# Altium footprint library Indruino.PcbLib: 383 footprints (part 9 of 24)
Each footprint in its own frame and in the unit in brackets; x right, y up, seen from the top. Pads: shape width x height; smd on the part's side, far side on the other; paste and mask are expansions set on the pad; w line width, h text height; cw(c..) or ccw(c..) is an arc to the next point about the centre after c.
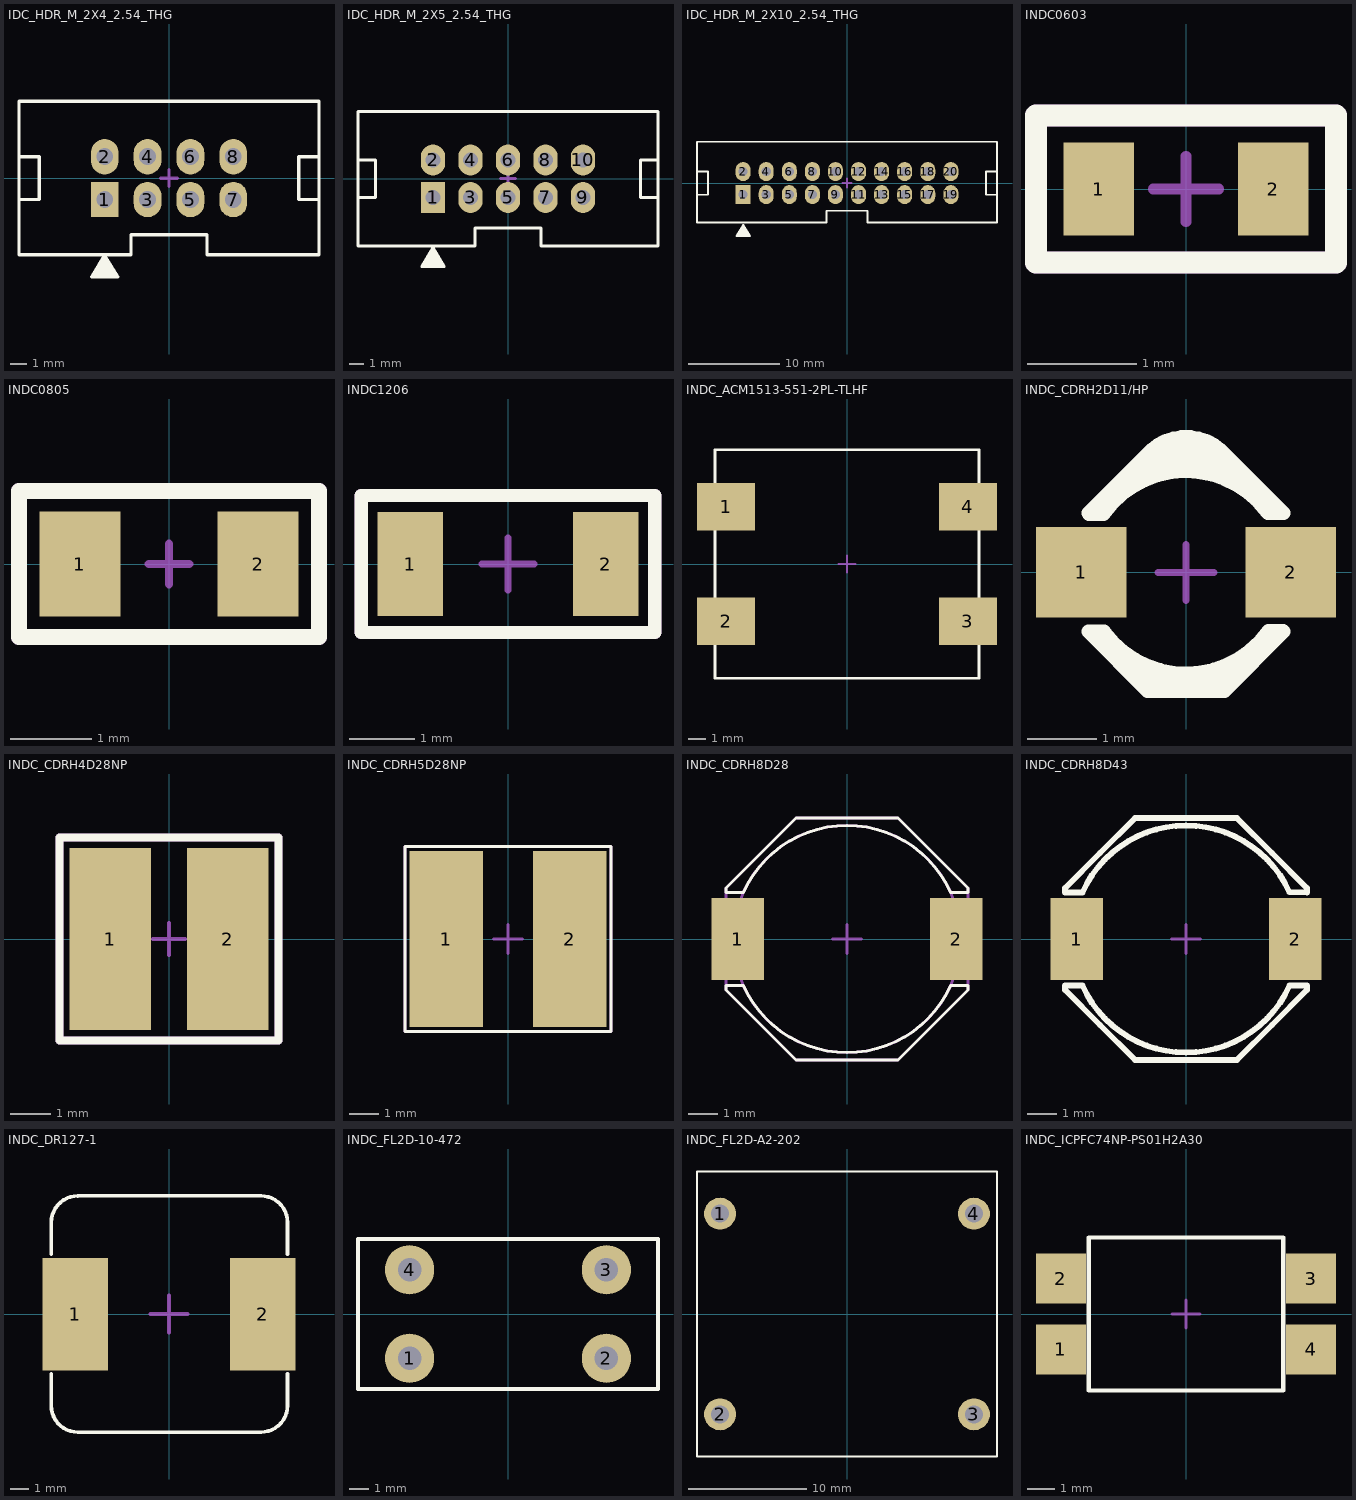
[diagram p8: the footprints below, top view; thin cyan lines are the x and y axes]

## IDC_HDR_M_2X4_2.54_THG [mm]
pads (8):
  rect 1.65x2.1 hole 1: 1(-3.81,-1.27)
  oval 1.65x2.1 hole 1: 2(-3.81,1.27) 3(-1.27,-1.27) 4(-1.27,1.27) 5(1.27,-1.27) 6(1.27,1.27) 7(3.81,-1.27) 8(3.81,1.27)
Top Overlay:
  region: -4.572,-5.842 -3.048,-5.842 -3.81,-4.572
  lines w0.2: -8.89,-1.27 -7.69,-1.27 -7.69,1.27 -8.89,1.27 ; 8.89,-1.27 7.69,-1.27 7.69,1.27 8.89,1.27 ; -8.89,-4.55 -2.25,-4.55 -2.25,-3.35 2.25,-3.35 2.25,-4.55 8.89,-4.55 8.89,4.55 -8.89,4.55 -8.89,-4.55 ; -4.572,-5.842 -3.048,-5.842 -3.81,-4.572 -4.572,-5.842
Mechanical 15:
  lines w0.2: -0.5,0 0.5,0 ; 0,-0.5 0,0.5
3D body "User Library-BH_08_V.STEP": height 8.9, standoff -3.2, extent -8.89,-4.45 8.89,4.65

## IDC_HDR_M_2X5_2.54_THG [mm]
pads (10):
  rect 1.65x2.1 hole 1: 1(-5.08,-1.27)
  oval 1.65x2.1 hole 1: 2(-5.08,1.27) 3(-2.54,-1.27) 4(-2.54,1.27) 5(0,-1.27) 6(0,1.27) 7(2.54,-1.27) 8(2.54,1.27) 9(5.08,-1.27) 10(5.08,1.27)
Top Overlay:
  region: -5.842,-5.942 -4.318,-5.942 -5.08,-4.672
  lines w0.2: -10.16,-1.27 -8.96,-1.27 -8.96,1.27 -10.16,1.27 ; 10.16,-1.27 8.96,-1.27 8.96,1.27 10.16,1.27 ; -10.16,-4.55 -10.16,4.55 10.16,4.55 10.16,-4.55 2.25,-4.55 2.25,-3.35 -2.25,-3.35 -2.25,-4.55 -10.16,-4.55 ; -5.842,-5.942 -4.318,-5.942 -5.08,-4.672 -5.842,-5.942
Mechanical 15:
  lines w0.2: -0.5,0 0.5,0 ; 0,-0.5 0,0.5
3D body "User Library-BH-10__64.STEP": height 9.1, standoff -3, extent -10.25,-4.65 10.25,4.65

## IDC_HDR_M_2X10_2.54_THG [mm]
pads (20):
  rect 1.65x2.1 hole 1: 1(-11.43,-1.27)
  oval 1.65x2.1 hole 1: 2(-11.43,1.27) 3(-8.89,-1.27) 4(-8.89,1.27) 5(-6.35,-1.27) 6(-6.35,1.27) 7(-3.81,-1.27) 8(-3.81,1.27) 9(-1.27,-1.27) 10(-1.27,1.27) 11(1.27,-1.27) 12(1.27,1.27) 13(3.81,-1.27) 14(3.81,1.27) 15(6.35,-1.27) 16(6.35,1.27) 17(8.89,-1.27) 18(8.89,1.27) 19(11.43,-1.27) 20(11.43,1.27)
Top Overlay:
  region: -12.192,-5.842 -10.668,-5.842 -11.43,-4.572
  lines w0.2: -16.51,-1.27 -15.31,-1.27 -15.31,1.27 -16.51,1.27 ; 16.51,-1.27 15.31,-1.27 15.31,1.27 16.51,1.27 ; -16.51,-4.318 -16.51,4.55 16.51,4.55 16.51,-4.318 2.25,-4.318 2.25,-3.048 -2.25,-3.048 -2.25,-4.318 -16.51,-4.318 ; -12.192,-5.842 -11.43,-4.572 -10.668,-5.842 -12.192,-5.842
Mechanical 15:
  lines w0.2: -0.5,0 0.5,0 ; 0,-0.5 0,0.5
3D body "User Library-idc-20_asm.STEP": height 9, standoff -3.2, extent -16.35,-4.064 16.35,4.436

## INDC0603 [mm]
pads (2):
  rect 0.65x0.85 smd: 1(-0.8,0) 2(0.8,0)
Top Overlay:
  lines w0.2: -1.375,-0.675 1.375,-0.675 1.375,0.675 -1.375,0.675 -1.375,-0.675
Mechanical 13:
  lines w0.2: -1.375,-0.675 1.375,-0.675 1.375,0.675 -1.375,0.675 -1.375,-0.675
  text "'.Designator'" at -1.03,-0.397 h0.7
Mechanical 15:
  lines w0.1: -0.3,0 0.3,0 ; 0,-0.3 0,0.3
3D body "User Library-cap_0603-1.STEP": height 0.79, standoff -0.01, extent -0.801,-0.394 0.799,0.406

## INDC0805 [mm]
pads (2):
  rect 1x1.3 smd: 1(-1.1,0) 2(1.1,0)
Top Overlay:
  lines w0.2: -1.85,-0.9 1.85,-0.9 1.85,0.9 -1.85,0.9 -1.85,-0.9
Mechanical 13:
  lines w0.2: -1.85,-0.9 -1.85,0.9 1.85,0.9 1.85,-0.9 -1.85,-0.9
  text "'.Designator'" at -1.475,-0.458 h0.8
Mechanical 15:
  lines w0.1: -0.25,0 0.25,0 ; 0,-0.25 0,0.25
3D body "User Library-Chip InductorINDC2012X130N.step": height 1.18, standoff -0.02, extent -1,-0.65 1,0.65

## INDC1206 [mm]
pads (2):
  rect 1x1.6 smd: 1(-1.5,0) 2(1.5,0)
Top Overlay:
  lines w0.2: -2.25,-1.05 -2.25,1.05 2.25,1.05 2.25,-1.05 -2.25,-1.05
Mechanical 13:
  lines w0.2: -2.25,-1.05 -2.25,1.05 2.25,1.05 2.25,-1.05 -2.25,-1.05
  text "'.Designator'" at -1.8,-0.383 h0.8
Mechanical 15:
  lines w0.1: -0.4,0 0.4,0 ; 0,-0.4 0,0.4
3D body "User Library-ind_1206.step": height 1.1, standoff 0, extent -1.6,-0.8 1.6,0.8

## INDC_ACM1513-551-2PL-TLHF [mm] "15mm x 13mm, Shielded, Nonstandard"
height 6
pads (4):
  rect 3.3x2.7 smd: 1(-6.875,3.25) 2(-6.875,-3.25) 3(6.875,-3.25) 4(6.875,3.25)
Top Overlay:
  lines w0.15: -7.5,-6.5 -7.5,6.5 7.5,6.5 7.5,-6.5 -7.5,-6.5
Mechanical 15:
  lines w0.1: -0.5,0 0.5,0 ; 0,-0.5 0,0.5
3D body "acm1513.step": height 5.58, standoff 0.07, extent -7.5,-6.5 7.5,6.5

## INDC_CDRH2D11/HP [mm] "Chip Inductor, Body 3.0x3.0mm, IPC High Density"
height 1.1
pads (2):
  rect 1.3x1.3 smd: 1(-1.5,0) 2(1.5,0)
Top Overlay:
  region: -1.4,-0.85 -0.55,-1.7 0.55,-1.7 1.4,-0.85 1.388,-0.838 1.183,-0.838 1.076,-0.972 0.819,-1.196 0.517,-1.355 0.185,-1.438 -0.156,-1.442 -0.489,-1.365 -0.795,-1.213 -1.056,-0.993 -1.166,-0.862 -1.178,-0.85
  region: -1.183,0.838 -1.076,0.972 -0.819,1.196 -0.517,1.355 -0.185,1.438 0.156,1.442 0.489,1.365 0.795,1.213 1.056,0.993 1.166,0.862 1.178,0.85 1.4,0.85 0.495,1.755 0.505,1.745 0.453,1.792 0.335,1.865 0.206,1.915 0.069,1.94 -0.069,1.94 -0.206,1.915 -0.335,1.865 -0.453,1.792 -0.505,1.745 -0.495,1.755 -1.4,0.85 -1.388,0.838
  lines w0.2: -1.4,0.85 -0.495,1.755 ; -1.388,0.838 -1.183,0.838 cw(c0,0) 1.166,0.862 ; -1.178,-0.85 -1.4,-0.85 -0.55,-1.7 0.55,-1.7 1.4,-0.85 ; -1.166,-0.862 ccw(c0,0) 1.183,-0.838 1.388,-0.838 ; -0.505,1.745 cw(c0,1.19) 0.505,1.745 ; 0.495,1.755 1.4,0.85 1.178,0.85
Mechanical 15:
  lines w0.1: -0.4,0 0.4,0 ; 0,-0.4 0,0.4
3D body "User Library-CDRH2D18-1.step": height 2.05, standoff 0, extent -2.263,-2.263 2.263,2.263

## INDC_CDRH4D28NP [mm] "Chip Inductor, Body 4.7x4.7mm, IPC High Density"
height 3
pads (2):
  rect 2x4.5 smd: 1(-1.45,0) 2(1.45,0)
Top Overlay:
  lines w0.2: -2.7,-2.5 -2.7,2.5 2.7,2.5 2.7,-2.5 -2.7,-2.5
Mechanical 13:
  lines w0.2: -2.7,-2.5 -2.7,2.5 2.7,2.5 2.7,-2.5 -2.7,-2.5
  text "'.Designator'" at -2.1,-0.5 h1.2
Mechanical 15:
  lines w0.1: -0.4,0 0.4,0 ; 0,-0.4 0,0.4
3D body "User Library-CDRH4D28.step": height 2.92, standoff 0.01, extent -2.45,-2.45 2.45,2.45

## INDC_CDRH5D28NP [mm] "Chip Inductor, Body 6.0x6.0mm, IPC High Density"
height 3
pads (2):
  rect 2.5x6 smd: 1(-2.1,0) 2(2.1,0)
Top Overlay:
  lines w0.1: -3.5,-3.15 3.5,-3.15 3.5,3.15 -3.5,3.15 -3.5,-3.15
Mechanical 13:
  lines w0.1: -3.5,-3.15 -3.5,3.15 3.5,3.15 3.5,-3.15 -3.5,-3.15
Mechanical 15:
  lines w0.1: -0.5,0 0.5,0 ; 0,-0.5 0,0.5
3D body "User Library-cdrh5d28.step": height 3, standoff 0, extent -3,-3 3,3

## INDC_CDRH8D28 [mm] "Chip Inductor, Body 8.3x8.3mm, IPC High Density"
height 3
pads (2):
  rect 1.8x2.8 smd: 1(-3.75,0) 2(3.75,0)
Top Overlay:
  lines w0.1: -3.558,-1.6 -4.15,-1.6 -4.15,-1.75 -2.95,-2.95 -1.75,-4.15 1.75,-4.15 2.95,-2.95 4.15,-1.75 4.15,-1.6 3.558,-1.6 ; -3.558,1.6 -4.15,1.6 -4.15,1.75 -2.95,2.95 -1.75,4.15 1.75,4.15 2.95,2.95 4.15,1.75 4.15,1.6 ; -3.556,-1.603 ccw(c0,0) 3.556,-1.603 ; -3.556,1.603 cw(c0,0) 3.556,1.603 4.147,1.603
Mechanical 13:
  lines w0.1: -4.15,-1.75 -2.95,-2.95 -1.75,-4.15 1.75,-4.15 2.95,-2.95 4.15,-1.75 4.15,1.75 2.95,2.95 1.75,4.15 -1.75,4.15 -2.95,2.95 -4.15,1.75 -4.15,-1.75 ; -3.9,0 ccw(c0,0) 3.9,0 ccw(c0,0) -3.9,0
Mechanical 15:
  lines w0.1: -0.5,0 0.5,0 ; 0,-0.5 0,0.5
3D body "User Library-CDRH8D28.step": height 2.8, standoff 0, extent -4.35,-4 4.35,4

## INDC_CDRH8D43 [mm] "Chip Inductor, Body 8.3x8.3mm, IPC High Density"
height 4.5
pads (2):
  rect 1.8x2.8 smd: 1(-3.75,0) 2(3.75,0)
Top Overlay:
  lines w0.2: -3.558,-1.6 -4.15,-1.6 -4.15,-1.75 -2.95,-2.95 -1.75,-4.15 1.75,-4.15 2.95,-2.95 4.15,-1.75 4.15,-1.6 3.558,-1.6 ; -3.558,1.6 -4.15,1.6 -4.15,1.75 -2.95,2.95 -1.75,4.15 1.75,4.15 2.95,2.95 4.15,1.75 4.15,1.6 ; -3.556,-1.603 ccw(c0,0) 3.556,-1.603 ; -3.556,1.603 cw(c0,0) 3.556,1.603 4.147,1.603
Mechanical 15:
  lines w0.1: -0.5,0 0.5,0 ; 0,-0.5 0,0.5
3D body "User Library-cdrh8d43.STEP": height 4.35, standoff 0, extent -5.657,-5.657 5.657,5.657

## INDC_DR127-1 [mm] "Chip Inductor, Body 12.5x12.5x8mm, IPC High Density"
height 8
pads (2):
  rect 3.5x6 smd: 1(-5,0) 2(5,0)
Top Overlay:
  lines w0.2: -6.28,-3.2 -6.28,-4.88 ccw(c-4.87,-4.89) -4.87,-6.3 4.91,-6.3 ccw(c4.91,-4.89) 6.32,-4.89 6.32,-3.2 ; -6.28,3.2 -6.28,4.88 cw(c-4.86,4.88) -4.86,6.3 4.91,6.3 cw(c4.91,4.89) 6.32,4.89 6.32,3.2
Mechanical 15:
  lines w0.2: -1,0 1,0 ; 0,-1 0,1
3D body "User Library-DR127-1.step": height 8, standoff 0, extent -6.255,-6.25 6.245,6.25

## INDC_FL2D-10-472 [mm]
pads (4):
  round 2.5 hole 1.2: 1(-5,-2.25) 2(5,-2.25) 3(5,2.25) 4(-5,2.25)
Top Overlay:
  lines w0.2: -7.62,-3.81 -7.62,3.81 7.62,3.81 7.62,-3.81 -7.62,-3.81
3D body "45690.stp": height 15.95, standoff -4.05, extent -7.252,-3.75 7.253,3.75

## INDC_FL2D-A2-202 [mm]
pads (4):
  round 2.7 hole 1.5: 1(-10.75,8.5) 2(-10.75,-8.5) 3(10.75,-8.5) 4(10.75,8.5)
Top Overlay:
  lines w0.2: -12.7,-12.065 -12.7,12.065 12.7,12.065 12.7,-12.065 -12.7,-12.065
3D body: height 15.5, standoff 0, extent -12.7,-12.065 12.7,12.065

## INDC_ICPFC74NP-PS01H2A30 [mm] "9.5mm x 5.7mm, Shielded, Nonstandard"
height 5.1
pads (4):
  rect 1.8x1.8 smd: 1(-4.5,-1.27) 2(-4.5,1.27) 3(4.5,1.27) 4(4.5,-1.27)
Top Overlay:
  lines w0.15: -3.5,-2.75 3.5,-2.75 3.5,2.75 -3.5,2.75 -3.5,-2.75
Mechanical 15:
  lines w0.1: -0.5,0 0.5,0 ; 0,-0.5 0,0.5
3D body: height 5.1, standoff 0, extent -3.5,-2.75 3.5,2.75